# Altium footprint library lib_datalogger.PcbLib: 866 footprints (part 3 of 55)
Each footprint in its own frame and in the unit in brackets; x right, y up, seen from the top. Pads: shape width x height; smd on the part's side, far side on the other; paste and mask are expansions set on the pad; w line width, h text height; cw(c..) or ccw(c..) is an arc to the next point about the centre after c.
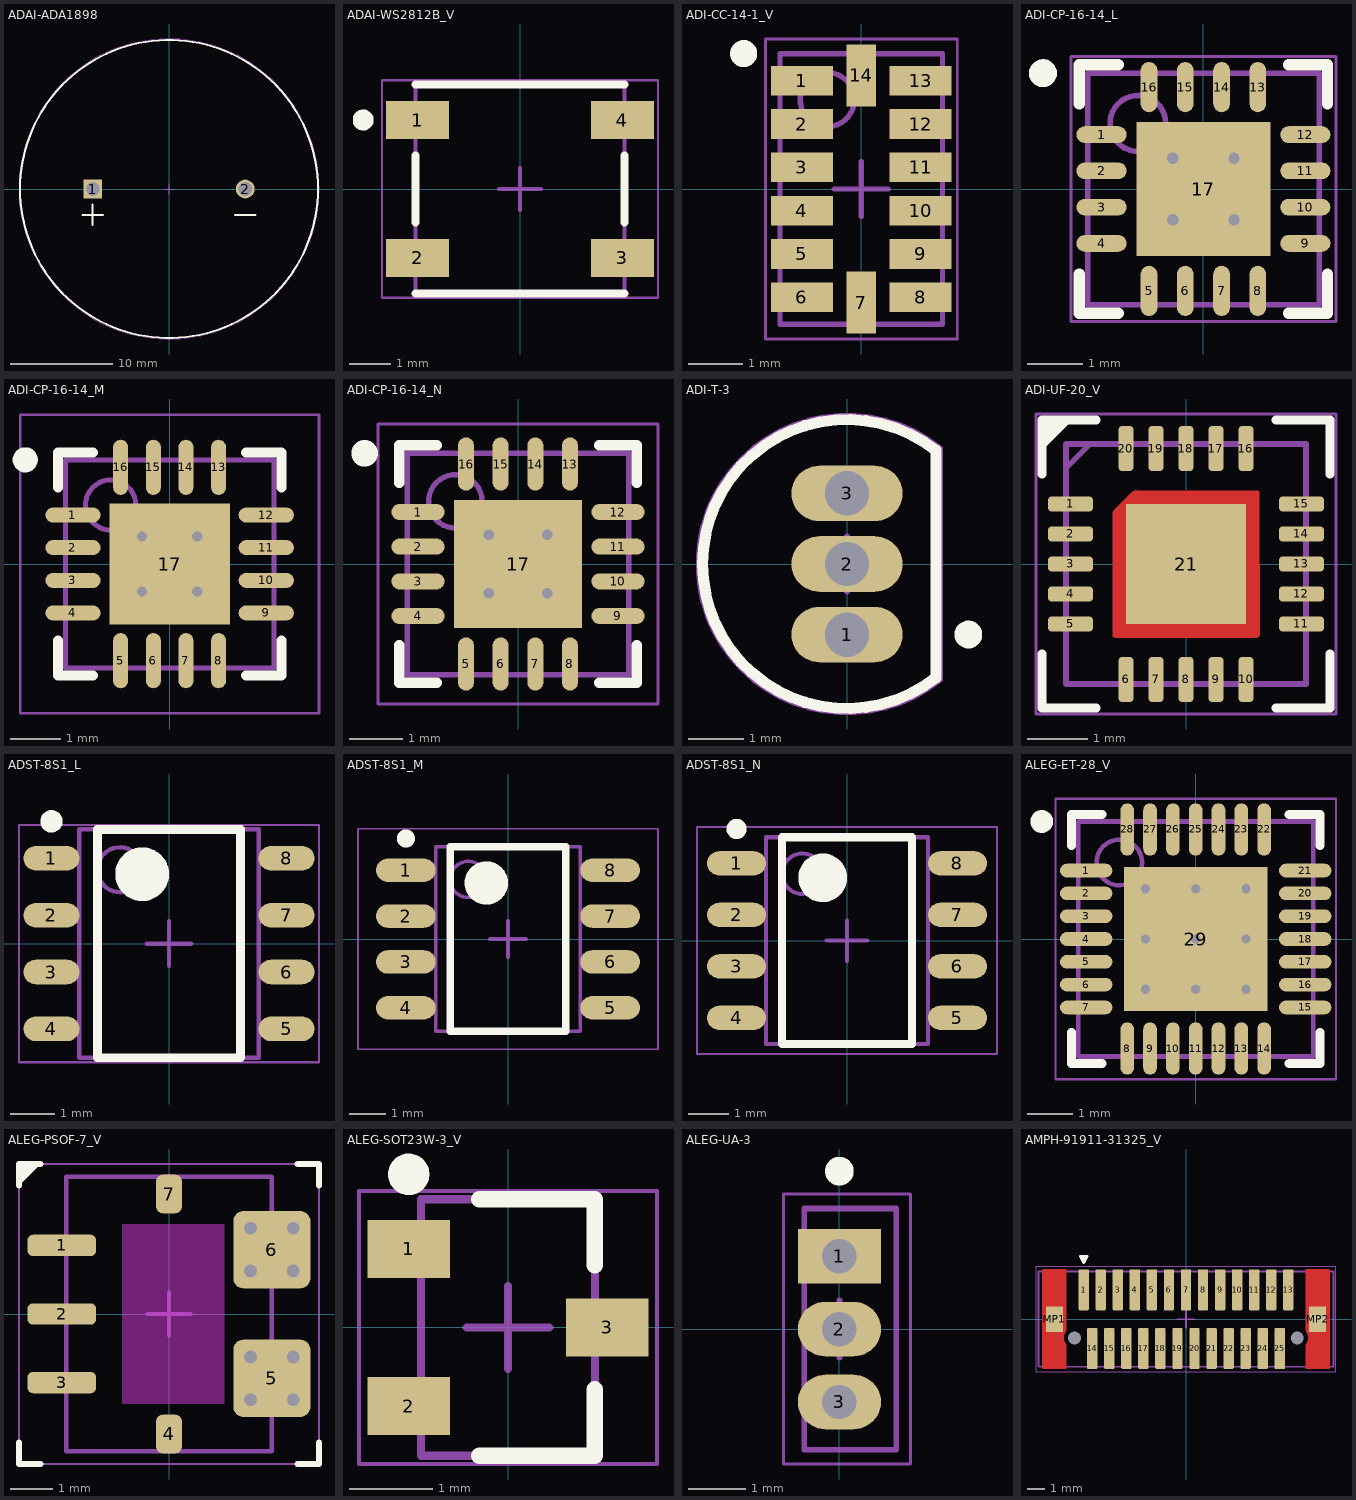
[diagram p2: the footprints below, top view; thin cyan lines are the x and y axes]

## ADAI-ADA1898 [mm] "THD, 2-Leads, Dia 29.3mm, Pitch 15mm"
height 11.95
pads (2):
  rect 1.85x1.85 hole 1.35: 1(-7.5,0)
  round 1.85 hole 1.35: 2(7.5,0)
Top Overlay:
  circle w0.2: c0,0 r14.65
  lines w0.2: -8.5,-2.54 -6.5,-2.54 ; -7.5,-3.54 -7.5,-1.54 ; 6.5,-2.54 8.5,-2.54
Mechanical 13:
  circle w0.1: c0,0 r14.65
Mechanical 15:
  circle w0.05: c0,0 r14.75
  lines w0.1: -0.5,0 0.5,0 ; 0,-0.5 0,0.5
3D body: height 11.95, standoff 0, extent -14.649,-14.649 14.649,14.649
3D body: height 6, standoff -6, extent -7.999,-0.499 -7.001,0.499
3D body: height 6, standoff -6, extent 6.994,-0.499 7.993,0.5

## ADAI-WS2812B_V [mm] "SMD, 4-Leads, Body 5x5mm, Pitch 3.3mm"
height 1.65
pads (4):
  rect 1.5x0.9 smd: 1(-2.45,1.65) 2(-2.45,-1.65) 3(2.45,-1.65) 4(2.45,1.65)
Top Overlay:
  circle w0.25: c-3.75,1.65 r0.125
  lines w0.2: -2.5,-2.5 2.5,-2.5 ; -2.5,-0.8 -2.5,0.8 ; -2.5,2.5 2.5,2.5 ; 2.5,-0.8 2.5,0.8
Mechanical 13:
  lines w0.1: -2.5,-2.5 -2.5,2.5 2.5,2.5 2.5,-2.5 -2.5,-2.5
Mechanical 15:
  lines w0.05: -3.3,-2.6 3.3,-2.6 3.3,2.6 -3.3,2.6 -3.3,-2.598
  lines w0.1: -0.5,0 0.5,0 ; 0,-0.5 0,0.5
3D body "User Library-WS2812B.STEP": height 1.69, standoff -0.01, extent -2.7,-2.5 2.7,2.5

## ADI-CC-14-1_V [mm] "LGA, 14-Leads, Body 5x3mm, Pitch 0.8mm"
height 1
pads (14):
  rect 1.145x0.55 smd: 1(-1.098,2) 2(-1.098,1.2) 3(-1.098,0.4) 4(-1.098,-0.4) 5(-1.098,-1.2) 6(-1.098,-2) 8(1.097,-2) 9(1.097,-1.2) 10(1.097,-0.4) 11(1.097,0.4) 12(1.097,1.2) 13(1.097,2)
  rect 0.55x1.145 smd: 7(0,-2.097) 14(0,2.098)
Top Overlay:
  circle w0.25: c-2.172,2.5 r0.125
Mechanical 13:
  circle w0.1: c-0.627,1.651 r0.5
  lines w0.1: -1.5,-2.5 1.5,-2.5 1.5,2.5 -1.5,2.5 -1.5,-2.5
Mechanical 15:
  lines w0.05: -1.77,-2.77 1.77,-2.77 1.77,2.77 -1.77,2.77 -1.77,-2.77
  lines w0.1: -0.5,0 0.5,0 ; 0,-0.5 0,0.5
3D body: height 1, standoff 0, extent -1.5,-2.5 1.5,2.5

## ADI-CP-16-14_L [mm] "QFN, 16-Leads, Body 4.15x4.15mm, Pitch 0.65mm, Thermal Pad 2.4x2.4mm, IPC High Density"
height 1.5
pads (17):
  oval 0.9x0.3 smd: 1(-1.825,0.975) 2(-1.825,0.325) 3(-1.825,-0.325) 4(-1.825,-0.975) 9(1.825,-0.975) 10(1.825,-0.325) 11(1.825,0.325) 12(1.825,0.975)
  oval 0.3x0.9 smd: 5(-0.975,-1.825) 6(-0.325,-1.825) 7(0.325,-1.825) 8(0.975,-1.825) 13(0.975,1.825) 14(0.325,1.825) 15(-0.325,1.825) 16(-0.975,1.825)
  rect 2.4x2.4 smd: 17(0,0)
via 0.55,-0.55 diameter 0.5 hole 0.2
via -0.55,-0.55 diameter 0.5 hole 0.2
via 0.55,0.55 diameter 0.5 hole 0.2
via -0.55,0.55 diameter 0.5 hole 0.2
Top Overlay:
  circle w0.25: c-2.875,2.075 r0.125
  lines w0.2: -2.225,-1.525 -2.225,-2.225 -1.525,-2.225 ; -2.225,1.525 -2.225,2.225 -1.525,2.225 ; 1.525,-2.225 2.225,-2.225 2.225,-1.525 ; 1.525,2.225 2.225,2.225 2.225,1.525
Mechanical 13:
  circle w0.1: c-1.175,1.175 r0.5
  lines w0.1: -2.075,-2.075 2.075,-2.075 2.075,2.075 -2.075,2.075 -2.075,-2.075
Mechanical 15:
  lines w0.05: -2.375,-2.375 2.375,-2.375 2.375,2.375 -2.375,2.375 -2.375,-2.375
  lines w0.1: -0.5,0 0.5,0 ; 0,-0.5 0,0.5
3D body "QFN65P400X400X150_HS-17L.step": height 1.5, standoff 0, extent -2.076,-2.076 2.076,2.076

## ADI-CP-16-14_M [mm] "QFN, 16-Leads, Body 4.15x4.15mm, Pitch 0.65mm, Thermal Pad 2.4x2.4mm, IPC Low Density"
height 1.5
pads (17):
  oval 1.1x0.3 smd: 1(-1.925,0.975) 2(-1.925,0.325) 3(-1.925,-0.325) 4(-1.925,-0.975) 9(1.925,-0.975) 10(1.925,-0.325) 11(1.925,0.325) 12(1.925,0.975)
  oval 0.3x1.1 smd: 5(-0.975,-1.925) 6(-0.325,-1.925) 7(0.325,-1.925) 8(0.975,-1.925) 13(0.975,1.925) 14(0.325,1.925) 15(-0.325,1.925) 16(-0.975,1.925)
  rect 2.4x2.4 smd: 17(0,0)
via 0.55,-0.55 diameter 0.5 hole 0.2
via -0.55,-0.55 diameter 0.5 hole 0.2
via 0.55,0.55 diameter 0.5 hole 0.2
via -0.55,0.55 diameter 0.5 hole 0.2
Top Overlay:
  circle w0.25: c-2.875,2.075 r0.125
  lines w0.2: -2.225,-1.525 -2.225,-2.225 -1.525,-2.225 ; -2.225,1.525 -2.225,2.225 -1.525,2.225 ; 1.525,-2.225 2.225,-2.225 2.225,-1.525 ; 1.525,2.225 2.225,2.225 2.225,1.525
Mechanical 13:
  circle w0.1: c-1.175,1.175 r0.5
  lines w0.1: -2.075,-2.075 2.075,-2.075 2.075,2.075 -2.075,2.075 -2.075,-2.075
Mechanical 15:
  lines w0.05: -2.975,-2.975 2.975,-2.975 2.975,2.975 -2.975,2.975 -2.975,-2.975
  lines w0.1: -0.5,0 0.5,0 ; 0,-0.5 0,0.5
3D body "QFN65P400X400X150_HS-17M.step": height 1.5, standoff 0, extent -2.076,-2.076 2.076,2.076

## ADI-CP-16-14_N [mm] "QFN, 16-Leads, Body 4.15x4.15mm, Pitch 0.65mm, Thermal Pad 2.4x2.4mm, IPC Medium Density"
height 1.5
pads (17):
  oval 1x0.3 smd: 1(-1.875,0.975) 2(-1.875,0.325) 3(-1.875,-0.325) 4(-1.875,-0.975) 9(1.875,-0.975) 10(1.875,-0.325) 11(1.875,0.325) 12(1.875,0.975)
  oval 0.3x1 smd: 5(-0.975,-1.875) 6(-0.325,-1.875) 7(0.325,-1.875) 8(0.975,-1.875) 13(0.975,1.875) 14(0.325,1.875) 15(-0.325,1.875) 16(-0.975,1.875)
  rect 2.4x2.4 smd: 17(0,0)
via 0.55,-0.55 diameter 0.5 hole 0.2
via -0.55,-0.55 diameter 0.5 hole 0.2
via 0.55,0.55 diameter 0.5 hole 0.2
via -0.55,0.55 diameter 0.5 hole 0.2
Top Overlay:
  circle w0.25: c-2.875,2.075 r0.125
  lines w0.2: -2.225,-1.525 -2.225,-2.225 -1.525,-2.225 ; -2.225,1.525 -2.225,2.225 -1.525,2.225 ; 1.525,-2.225 2.225,-2.225 2.225,-1.525 ; 1.525,2.225 2.225,2.225 2.225,1.525
Mechanical 13:
  circle w0.1: c-1.175,1.175 r0.5
  lines w0.1: -2.075,-2.075 2.075,-2.075 2.075,2.075 -2.075,2.075 -2.075,-2.075
Mechanical 15:
  lines w0.05: -2.625,-2.625 2.625,-2.625 2.625,2.625 -2.625,2.625 -2.625,-2.625
  lines w0.1: -0.5,0 0.5,0 ; 0,-0.5 0,0.5
3D body "QFN65P400X400X150_HS-17N.step": height 1.5, standoff 0, extent -2.076,-2.076 2.076,2.076

## ADI-T-3 [mm] "TO, 3-Leads, Dia 5.2mm"
height 5.33
pads (3):
  oval 2x1 hole 0.8: 1(0,-1.27) 2(0,0) 3(0,1.27)
Top Overlay:
  circle w0.25: c2.184,-1.27 r0.125
  lines w0.2: 1.601,-2.049 cw(c0,0) 1.601,2.049 1.6,-2.049
Mechanical 13:
  lines w0.1: 1.601,-2.049 cw(c0,0) 1.601,2.049 1.6,-2.049
Mechanical 15:
  lines w0.05: 1.7,-2.098 cw(c0,0) 1.7,2.098 ; 1.7,-2.098 1.7,2.098
  lines w0.1: -0.5,0 0.5,0 ; 0,-0.5 0,0.5
3D body: height 5.33, standoff 0, extent -2.599,-2.611 1.6,2.611
3D body: height 0, standoff -12.7, extent -0.234,1.036 0.234,1.504
3D body: height 0, standoff -12.7, extent -0.234,-0.234 0.235,0.235
3D body: height 0, standoff -12.7, extent -0.234,-1.504 0.235,-1.035

## ADI-UF-20_V [mm] "SMD, 20-Leads, Body 4x4mm, Pitch 0.5mm"
height 0.8
pads (21):
  rrect50% 0.75x0.25 smd: 1(-1.925,1) 2(-1.925,0.5) 3(-1.925,0) 4(-1.925,-0.5) 5(-1.925,-1) 11(1.925,-1) 12(1.925,-0.5) 13(1.925,0) 14(1.925,0.5) 15(1.925,1)
  rrect50% 0.25x0.75 smd: 6(-1,-1.925) 7(-0.5,-1.925) 8(0,-1.925) 9(0.5,-1.925) 10(1,-1.925) 16(1,1.925) 17(0.5,1.925) 18(0,1.925) 19(-0.5,1.925) 20(-1,1.925)
  rect 2x2 smd: 21(0,0)
Top Layer:
  region: -1.225,-1.175 -1.225,0.825 -1.225,0.837 -1.22,0.86 -1.211,0.882 -1.198,0.902 -1.19,0.91 -0.91,1.19 -0.902,1.198 -0.882,1.211 -0.86,1.22 -0.837,1.225 -0.825,1.225 1.175,1.225 1.185,1.225 1.203,1.217 1.217,1.203 1.225,1.185 1.225,1.175 1.225,-1.175 1.225,-1.185 1.217,-1.203 1.203,-1.217 1.185,-1.225 1.175,-1.225 -1.175,-1.225 -1.185,-1.225 -1.203,-1.217 -1.217,-1.203 -1.225,-1.185
Top Overlay:
  region: -2.4,2.4 -2.4,2 -2,2.4
  lines w0.15: -2.4,-1.5 -2.4,-2.4 -1.5,-2.4 ; -2.4,1.5 -2.4,2.4 -1.5,2.4 ; -2.4,2 -2,2.4 ; 1.5,-2.4 2.4,-2.4 2.4,-1.5 ; 1.5,2.4 2.4,2.4 2.4,1.5
Mechanical 13:
  lines w0.1: -2,1.6 -1.6,2 ; -2,-2 2,-2 2,2 -2,2 -2,-2
Mechanical 15:
  lines w0.05: -2.5,-2.5 -2.5,2.5 2.5,2.5 2.5,-2.5 -2.5,-2.5
  lines w0.1: -0.5,0 0.5,0 ; 0,-0.5 0,0.5
Top Designator:
  text ".Designator" at -1.27,-0.127 h0.6
3D body "ltc4418iuf_UF_20.stp": height 0.81, standoff 0, extent -2.045,-2.045 2.045,2.045

## ADST-8S1_L [mm] "SOIC, 8-Leads, Body 5.1x4mm, Pitch 1.27mm, IPC High Density"
height 1.75
pads (8):
  oval 1.25x0.55 smd: 1(-2.625,1.905) 2(-2.625,0.635) 3(-2.625,-0.635) 4(-2.625,-1.905) 5(2.625,-1.905) 6(2.625,-0.635) 7(2.625,0.635) 8(2.625,1.905)
Top Overlay:
  circle w0.25: c-2.625,2.73 r0.125
  circle w0.6: c-0.6,1.55 r0.3
  lines w0.2: -1.6,-2.55 -1.6,2.55 1.6,2.55 1.6,-2.55 -1.6,-2.55
Mechanical 13:
  circle w0.1: c-1.1,1.65 r0.5
  lines w0.1: -2,-2.55 -2,2.55 2,2.55 2,-2.55 -2,-2.55
Mechanical 15:
  lines w0.05: -3.35,-2.65 -3.35,2.65 3.35,2.65 3.35,-2.65 -3.35,-2.65
  lines w0.1: -0.5,0 0.5,0 ; 0,-0.5 0,0.5
3D body "SOIC127P600X175-8L.step": height 1.75, standoff 0, extent -2.997,-2.55 2.997,2.55

## ADST-8S1_M [mm] "SOIC, 8-Leads, Body 5.1x4mm, Pitch 1.27mm, IPC Low Density"
height 1.75
pads (8):
  oval 1.65x0.65 smd: 1(-2.825,1.905) 2(-2.825,0.635) 3(-2.825,-0.635) 4(-2.825,-1.905) 5(2.825,-1.905) 6(2.825,-0.635) 7(2.825,0.635) 8(2.825,1.905)
Top Overlay:
  circle w0.25: c-2.825,2.78 r0.125
  circle w0.6: c-0.6,1.55 r0.3
  lines w0.2: -1.6,-2.55 -1.6,2.55 1.6,2.55 1.6,-2.55 -1.6,-2.55
Mechanical 13:
  circle w0.1: c-1.1,1.65 r0.5
  lines w0.1: -2,-2.55 -2,2.55 2,2.55 2,-2.55 -2,-2.55
Mechanical 15:
  lines w0.05: -4.15,-3.05 -4.15,3.05 4.15,3.05 4.15,-3.05 -4.15,-3.05
  lines w0.1: -0.5,0 0.5,0 ; 0,-0.5 0,0.5
3D body "SOIC127P600X175-8M.step": height 1.75, standoff 0, extent -2.997,-2.55 2.997,2.55

## ADST-8S1_N [mm] "SOIC, 8-Leads, Body 5.1x4mm, Pitch 1.27mm, IPC Medium Density"
height 1.75
pads (8):
  oval 1.45x0.6 smd: 1(-2.725,1.905) 2(-2.725,0.635) 3(-2.725,-0.635) 4(-2.725,-1.905) 5(2.725,-1.905) 6(2.725,-0.635) 7(2.725,0.635) 8(2.725,1.905)
Top Overlay:
  circle w0.25: c-2.725,2.755 r0.125
  circle w0.6: c-0.6,1.55 r0.3
  lines w0.2: -1.6,-2.55 -1.6,2.55 1.6,2.55 1.6,-2.55 -1.6,-2.55
Mechanical 13:
  circle w0.1: c-1.1,1.65 r0.5
  lines w0.1: -2,-2.55 -2,2.55 2,2.55 2,-2.55 -2,-2.55
Mechanical 15:
  lines w0.05: -3.7,-2.8 -3.7,2.8 3.7,2.8 3.7,-2.8 -3.7,-2.8
  lines w0.1: -0.5,0 0.5,0 ; 0,-0.5 0,0.5
3D body "SOIC127P600X175-8N.step": height 1.75, standoff 0, extent -2.997,-2.55 2.997,2.55

## ALEG-ET-28_V [mm] "QFN, 28-Leads, Body 5.15x5.15mm, Pitch 0.5mm, Thermal Pad 3.15x3.15mm"
height 1
pads (29):
  oval 1.15x0.3 smd: 1(-2.4,1.5) 2(-2.4,1) 3(-2.4,0.5) 4(-2.4,0) 5(-2.4,-0.5) 6(-2.4,-1) 7(-2.4,-1.5) 15(2.4,-1.5) 16(2.4,-1) 17(2.4,-0.5) 18(2.4,0) 19(2.4,0.5) 20(2.4,1) 21(2.4,1.5)
  oval 0.3x1.15 smd: 8(-1.5,-2.4) 9(-1,-2.4) 10(-0.5,-2.4) 11(0,-2.4) 12(0.5,-2.4) 13(1,-2.4) 14(1.5,-2.4) 22(1.5,2.4) 23(1,2.4) 24(0.5,2.4) 25(0,2.4) 26(-0.5,2.4) 27(-1,2.4) 28(-1.5,2.4)
  rect 3.15x3.15 smd: 29(0,0)
via -1.1,1.1 diameter 0.5 hole 0.2
via 0,1.1 diameter 0.5 hole 0.2
via 1.1,1.1 diameter 0.5 hole 0.2
via -1.1,0 diameter 0.5 hole 0.2
via 0,0 diameter 0.5 hole 0.2
via 1.1,0 diameter 0.5 hole 0.2
via -1.1,-1.1 diameter 0.5 hole 0.2
via 0,-1.1 diameter 0.5 hole 0.2
via 1.1,-1.1 diameter 0.5 hole 0.2
Top Overlay:
  circle w0.25: c-3.375,2.575 r0.125
  lines w0.2: -2.725,-2.05 -2.725,-2.725 -2.05,-2.725 ; -2.725,2.05 -2.725,2.725 -2.05,2.725 ; 2.05,-2.725 2.725,-2.725 2.725,-2.05 ; 2.05,2.725 2.725,2.725 2.725,2.05
Mechanical 13:
  circle w0.1: c-1.675,1.675 r0.5
  lines w0.1: -2.575,-2.575 -2.575,2.575 2.575,2.575 2.575,-2.575 -2.575,-2.575
Mechanical 15:
  lines w0.05: -3.075,-3.075 -3.075,3.075 3.075,3.075 3.075,-3.075 -3.075,-3.075
  lines w0.1: -0.5,0 0.5,0 ; 0,-0.5 0,0.5
3D body "QFN50P500X500X100_HS-29L.step": height 1, standoff 0, extent -2.576,-2.576 2.576,2.576

## ALEG-PSOF-7_V [mm] "SOF, 8-Leads, Body 4.8x6.4mm"
height 1.6
pads (7):
  rrect50% 1.6x0.5 smd: 1(-2.5,1.6) 2(-2.5,0) 3(-2.5,-1.6)
  rrect50% 0.6x0.9 smd: 4(0,-2.8) 7(0,2.8)
  rrect25% 1.8x1.8 smd: 5(2.4,-1.5) 6(2.4,1.5)
via 1.9,2 diameter 0.6 hole 0.3
via 2.9,2 diameter 0.6 hole 0.3
via 1.9,1 diameter 0.6 hole 0.3
via 2.9,1 diameter 0.6 hole 0.3
via 1.9,-1 diameter 0.6 hole 0.3
via 2.9,-1 diameter 0.6 hole 0.3
via 1.9,-2 diameter 0.6 hole 0.3
via 2.9,-2 diameter 0.6 hole 0.3
Top Overlay:
  region: -3.5,3.5 -3.5,3.1 -3.1,3.5
  lines w0.15: -3.5,-3 -3.5,-3.5 -3,-3.5 ; -3.5,3 -3.5,3.5 -3,3.5 ; -3.1,3.5 -3.5,3.1 ; 3,-3.5 3.5,-3.5 3.5,-3 ; 3,3.5 3.5,3.5 3.5,3 ; -3.5,3.1 -3.5,3.1
Keep-Out Layer:
  rectangle: -1.1,-2.1 1.3,2.1
Mechanical 13:
  lines w0.1: -2.4,-3.2 2.4,-3.2 2.4,3.2 -2.4,3.2 -2.4,-3.2
Mechanical 15:
  lines w0.05: -3.5,-3.5 3.5,-3.5 3.5,3.5 -3.5,3.5 -3.5,-3.5
  lines w0.1: -0.5,0 0.5,0 ; 0,-0.5 0,0.5
Top Designator:
  text ".Designator" at -1.27,-0.127 h0.6
3D body "7-Pin PSOF Package.STEP": height 1.49, standoff 0.01, extent -3.2,-3.2 3.2,3.2

## ALEG-SOT23W-3_V [mm] "SOT23, 3-Leads, Body 3.1x2.1mm, Pitch 0.95mm"
height 1.13
pads (3):
  rect 1x0.7 smd: 1(-1.2,0.95) 2(-1.2,-0.95) 3(1.2,0)
Top Overlay:
  circle w0.25: c-1.2,1.85 r0.125
  lines w0.2: -0.35,-1.55 1.05,-1.55 1.05,-0.75 ; -0.35,1.55 1.05,1.55 1.05,0.75
Mechanical 13:
  lines w0.1: -1.05,-1.55 1.05,-1.55 1.05,1.55 -1.05,1.55 -1.05,-1.55
Mechanical 15:
  lines w0.05: -1.8,-1.65 1.8,-1.65 1.8,1.65 -1.8,1.65 -1.8,-1.65
  lines w0.1: -0.5,0 0.5,0 ; 0,-0.5 0,0.5
3D body "SOT95P294X113-3L.step": height 1.13, standoff 0, extent -1.5,-1.55 1.5,1.55

## ALEG-UA-3 [mm] "SIP, 3-Leads, Body 4.2x1.6mm, Pitch 1.27 mm"
height 4.12
pads (3):
  rect 1.45x0.95 hole 0.6: 1(0,1.27)
  oval 1.45x0.95 hole 0.6: 2(0,0) 3(0,-1.27)
Top Overlay:
  circle w0.25: c0,2.75 r0.125
Mechanical 13:
  lines w0.1: -0.61,-2.1 -0.61,2.1 0.99,2.1 0.99,-2.1 -0.61,-2.1
Mechanical 15:
  lines w0.05: -0.975,-2.35 -0.975,2.35 1.24,2.35 1.24,-2.35 -0.975,-2.35
  lines w0.1: -0.5,0 0.5,0 ; 0,-0.5 0,0.5
3D body: height 4.12, standoff 1.02, extent -0.61,-2.1 0.99,2.1
3D body: height 1.02, standoff 0, extent -0.2,0.92 0.2,1.62
3D body: height 0, standoff -1.6, extent -0.2,1.06 0.2,1.48
3D body: height 1.02, standoff 0, extent -0.2,-0.35 0.2,0.35
3D body: height 0, standoff -1.6, extent -0.2,-0.21 0.2,0.21
3D body: height 1.02, standoff 0, extent -0.2,-1.62 0.2,-0.92
3D body: height 0, standoff -1.6, extent -0.2,-1.48 0.2,-1.06

## AMPH-91911-31325_V [mm] "SMD, 25-Leads, Body 5.59x17.3mm, Pitch 1mm"
height 5
pads (29):
  rrect25% 0.61x2.41 smd paste-0.61: 1(-6,1.72) 2(-5,1.72) 3(-4,1.72) 4(-3,1.72) 5(-2,1.72) 6(-1,1.72) 7(0,1.72) 8(1,1.72) 9(2,1.72) 10(3,1.72) 11(4,1.72) 12(5,1.72) 13(6,1.72) 14(-5.5,-1.72) 15(-4.5,-1.72) 16(-3.5,-1.72) 17(-2.5,-1.72) 18(-1.5,-1.72) 19(-0.5,-1.72) 20(0.5,-1.72) 21(1.5,-1.72) 22(2.5,-1.72) 23(3.5,-1.72) 24(4.5,-1.72) 25(5.5,-1.72)
  round 0 hole 0.76 unplated: H1(-6.528,-1.1) H2(6.528,-1.1)
  rect 1x1.5 smd paste-0.61: MP1(-7.72,0) MP2(7.72,0)
Top Layer:
  region: -8.42,-2.855 -8.42,2.855 -8.42,2.869 -8.409,2.895 -8.39,2.914 -8.364,2.925 -8.35,2.925 -7.1,2.925 -7.084,2.925 -7.055,2.913 -7.032,2.89 -7.02,2.861 -7.02,2.845 -7.02,-0.689 -7.084,-0.78 -7.159,-0.989 -7.159,-1.211 -7.083,-1.419 -7.019,-1.511 -7.02,-2.845 -7.02,-2.861 -7.032,-2.89 -7.055,-2.913 -7.084,-2.925 -7.1,-2.925 -8.35,-2.925 -8.364,-2.925 -8.39,-2.914 -8.409,-2.895 -8.42,-2.869
  region: 8.42,-2.855 8.42,2.855 8.42,2.869 8.409,2.895 8.39,2.914 8.364,2.925 8.35,2.925 7.1,2.925 7.084,2.925 7.055,2.913 7.032,2.89 7.02,2.861 7.02,2.845 7.02,-0.689 7.084,-0.78 7.159,-0.989 7.159,-1.211 7.083,-1.419 7.019,-1.511 7.02,-2.845 7.02,-2.861 7.032,-2.89 7.055,-2.913 7.084,-2.925 7.1,-2.925 8.35,-2.925 8.364,-2.925 8.39,-2.914 8.409,-2.895 8.42,-2.869
Top Overlay:
  region: -5.8,3.7 -6.2,3.7 -6,3.3
  lines w0.15: -6.2,3.7 -5.8,3.7 -6,3.3 -6.2,3.7
Top Paste:
  rectangle: -6.255,0.615 -5.745,2.925
  rectangle: -5.255,0.615 -4.745,2.925
  rectangle: -4.255,0.615 -3.745,2.925
  rectangle: -3.255,0.615 -2.745,2.925
  rectangle: -2.255,0.615 -1.745,2.925
  rectangle: -1.255,0.615 -0.745,2.925
  rectangle: -0.255,0.615 0.255,2.925
  rectangle: 0.745,0.615 1.255,2.925
  rectangle: 1.745,0.615 2.255,2.925
  rectangle: 2.745,0.615 3.255,2.925
  rectangle: 3.745,0.615 4.255,2.925
  rectangle: 4.745,0.615 5.255,2.925
  rectangle: 5.745,0.615 6.255,2.925
  region: -5.245,-0.615 -5.755,-0.615 -5.755,-2.925 -5.245,-2.925
  region: -4.245,-0.615 -4.755,-0.615 -4.755,-2.925 -4.245,-2.925
  region: -3.245,-0.615 -3.755,-0.615 -3.755,-2.925 -3.245,-2.925
  region: -2.245,-0.615 -2.755,-0.615 -2.755,-2.925 -2.245,-2.925
  region: -1.245,-0.615 -1.755,-0.615 -1.755,-2.925 -1.245,-2.925
  region: -0.245,-0.615 -0.755,-0.615 -0.755,-2.925 -0.245,-2.925
  region: 0.755,-0.615 0.245,-0.615 0.245,-2.925 0.755,-2.925
  region: 1.755,-0.615 1.245,-0.615 1.245,-2.925 1.755,-2.925
  region: 2.755,-0.615 2.245,-0.615 2.245,-2.925 2.755,-2.925
  region: 3.755,-0.615 3.245,-0.615 3.245,-2.925 3.755,-2.925
  region: 4.755,-0.615 4.245,-0.615 4.245,-2.925 4.755,-2.925
  region: 5.755,-0.615 5.245,-0.615 5.245,-2.925 5.755,-2.925
  region: -8.42,-2.925 -7.53,-2.925 -7.53,2.925 -8.42,2.925
  region: 8.42,-2.925 7.53,-2.925 7.53,2.925 8.42,2.925
Mechanical 13:
  lines w0.1: -8.65,-2.795 8.65,-2.795 8.65,2.795 -8.65,2.795 -8.65,-2.795
Mechanical 15:
  lines w0.05: -8.8,-3.1 -8.8,3.1 8.8,3.1 8.8,-3.1 -8.8,-3.1
  lines w0.1: -0.5,0 0.5,0 ; 0,-0.5 0,0.5
Top Designator:
  text ".Designator" at -1.27,-0.127 h0.6
3D body: height 5, standoff 0, extent -8.65,-2.795 8.65,2.795